# Altium footprint library PcbLib_Discrete_ThroughHole.PcbLib: 104 footprints (part 5 of 7)
Each footprint in its own frame and in the unit in brackets; x right, y up, seen from the top. Pads: shape width x height; smd on the part's side, far side on the other; paste and mask are expansions set on the pad; w line width, h text height; cw(c..) or ccw(c..) is an arc to the next point about the centre after c.
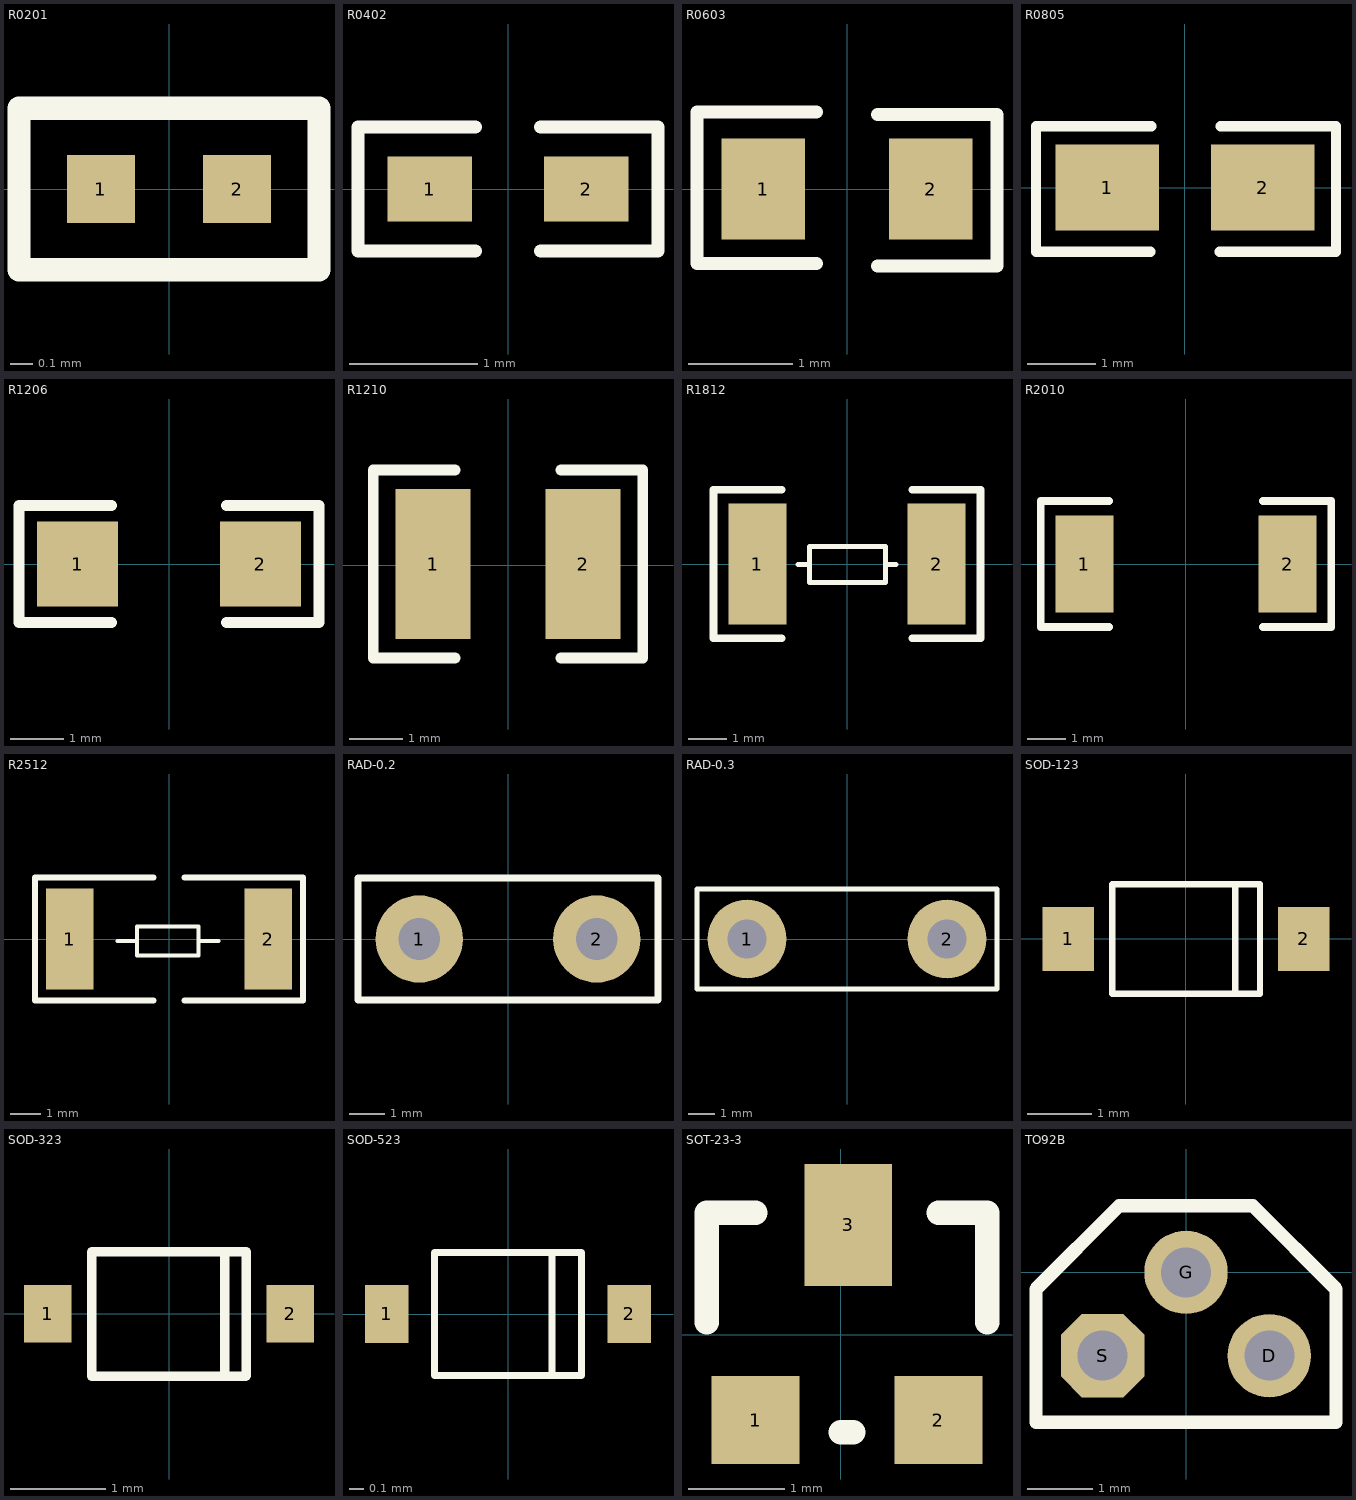
[diagram p4: the footprints below, top view; thin cyan lines are the x and y axes]

## R0201 [mm] "1/20W (0.05W)"
pads (2):
  rect 0.3x0.3 smd: 1(-0.3,0) 2(0.3,0)
Top Overlay:
  lines w0.102: -0.66,-0.356 0.66,-0.356 0.66,0.356 -0.66,0.356 -0.66,-0.356
3D body "Res-0201.STEP": height 0.24, standoff -0.01, extent -0.325,-0.162 0.325,0.162

## R0402 [mil] "1/16W (0.0625W)"
pads (2):
  rect 26x20 smd: 1(-24,0) 2(24,0)
Top Overlay:
  lines w4: -10,-19 -46,-19 -46,19 -10,19 ; 10,-19 46,-19 46,19 10,19
3D body "RESC-0402-Black.STEP": height 16.14, standoff 0, extent -23.01,-10.82 18.33,10.83

## R0603 [mm] "1/10W (0.1W)"
pads (2):
  rect 0.8x0.965 smd: 1(-0.8,0) 2(0.8,0)
Top Overlay:
  lines w0.127: -1.435,-0.712 -0.292,-0.712 ; -1.435,-0.7 -1.435,0.737 -0.292,0.737 ; 0.292,-0.737 1.435,-0.737 1.435,0.7 ; 0.292,0.712 1.435,0.712
3D body "RESC-0603-Black.STEP": height 0.56, standoff 0, extent -0.9,-0.45 0.8,0.45

## R0805 [mil] "1/8W (0.125W)"
pads (2):
  rect 60x50 smd: 1(-45,0) 2(45,0)
Top Overlay:
  lines w6: -20,-37.13 -86.34,-37.13 -86.34,35.43 -19.41,35.43 ; 20,-37.13 86.93,-37.13 ; 20.59,35.43 87.52,35.43 87.52,-37.13
3D body "RESC-0805-Black.STEP": height 24.02, standoff 0, extent -44.01,-26.57 38.67,26.58

## R1206 [mil] "1/4W (0.25W)"
pads (2):
  rect 60x62.99 smd: 1(-67.5,0) 2(67.5,0)
Top Overlay:
  lines w8: -42.5,-43.31 -110.81,-43.31 -110.81,43.31 -42.5,43.31 ; 42.5,-43.31 110.81,-43.31 110.81,43.31 42.5,43.31
3D body "RESC-1206-Black.STEP": height 25.98, standoff 0, extent -65.52,-32.87 64.4,34.06

## R1210 [mm] "1/2W (0.5W)，1/3W (0.33W)"
height 1.45
pads (2):
  rect 1.4x2.8 smd: 1(-1.4,0.025) 2(1.4,0.025)
Top Overlay:
  lines w0.203: -0.991,-1.728 -2.515,-1.728 -2.515,1.778 -0.991,1.778 ; 0.991,-1.728 2.515,-1.728 2.515,1.778 0.991,1.778
3D body "RESC-1210-Black.STEP": height 0.61, standoff 0, extent -1.65,-1.35 1.65,1.35

## R1812 [mil] "1/2W (0.5W)，3/4W (0.75W)"
pads (2):
  rect 60x125 smd: 1(-92.5,0) 2(92.5,0)
Top Overlay:
  lines w5.12: -50.5,-0.61 -38.87,-0.61 ; 39.87,-0.61 50.5,-0.61 ; -38.87,-19.31 39.87,-19.31 39.87,18.09 -38.87,18.09 -38.87,-19.31
  lines w8: -67.5,-76.77 -138,-76.77 -138,76.77 -67.5,76.77 ; 67.5,-76.77 138,-76.77 138,76.77 67.5,76.77
3D body "User Library-Resistors1812.STEP": height 24.11, standoff -0.49, extent -97.07,-63.49 82.06,63.48

## R2010 [mm] "3/4W (0.75W)"
pads (2):
  rect 1.52x2.54 smd: 1(-2.665,0) 2(2.665,0)
Top Overlay:
  lines w0.203: -2.017,-1.651 -3.808,-1.651 -3.808,1.651 -2.017,1.651 ; 2.017,-1.651 3.808,-1.651 3.808,1.651 2.017,1.651
3D body "2010R.STEP": height 0.47, standoff 0, extent -2.498,-1.251 2.502,1.251

## R2512 [mil] "1W, 2W, ＞2W"
pads (2):
  rect 61x129.92 smd: 1(-127.5,0) 2(127.5,0)
Top Overlay:
  lines w5.12: -66.35,-2.61 -40.76,-2.61 ; 37.98,-2.61 63.57,-2.61 ; -40.76,-21.31 37.98,-21.31 37.98,16.09 -40.76,16.09 -40.76,-21.31
  lines w8: -20,-78.74 -171.78,-78.74 -171.78,78.74 -20,78.74 ; 20,-78.74 171.78,-78.74 171.78,78.74 20,78.74
3D body "R2512-2.STEP": height 27.56, standoff 0, extent -129.92,-66.93 129.92,66.93

## RAD-0.2 [mm]
pads (2):
  round 2.5 hole 1.2: 1(-2.54,0) 2(2.54,0)
Top Overlay:
  lines w0.2: -4.293,-1.753 4.293,-1.753 4.293,1.753 -4.293,1.753 -4.293,-1.753
3D body "User Library-Ceramic Disc Capacitor 0_2in pitch.STEP": height 7.06, standoff -1.44, extent -3.5,-0.848 3.5,0.848

## RAD-0.3 [mm]
pads (2):
  round 3 hole 1.5: 1(-3.81,0) 2(3.81,0)
Top Overlay:
  lines w0.2: -5.715,-1.905 5.715,-1.905 5.715,1.905 -5.715,1.905 -5.715,-1.905
3D body "User Library-Capacitor MKT_B32591C3104 (Pitch 10mm).STEP": height 11.5, standoff -7, extent -6.373,-2.46 6.627,2.54

## SOD-123 [mm] "塑封二极管"
pads (2):
  rect 0.8x1 smd: 1(-1.829,0) 2(1.829,0)
Top Overlay:
  lines w0.1: 0.762,-0.85 0.762,0.85 ; -1.143,-0.85 1.149,-0.85 1.149,0.85 -1.143,0.85 -1.143,-0.85
3D body "SOD-123_DiodesInc.STEP": height 1.43, standoff -0.02, extent -1.9,-0.889 1.95,0.811

## SOD-323 [mm] "塑封二极管"
pads (2):
  rect 0.5x0.6 smd: 1(-1.27,0) 2(1.27,0)
Top Overlay:
  lines w0.1: 0.584,-0.651 0.584,0.649 ; 0.805,-0.649 0.803,-0.651 -0.81,-0.651 -0.81,0.649 0.81,0.649 0.81,-0.649
3D body "SOD323.STEP": height 0.9, standoff -0.09, extent -1.25,-0.625 1.25,0.625

## SOD-523 [mm] "塑封二极管"
pads (2):
  rect 0.3x0.4 smd: 1(-0.838,0) 2(0.838,0)
Top Overlay:
  lines w0.05: 0.305,-0.425 0.305,0.425 ; -0.508,-0.425 0.508,-0.425 0.508,0.425 -0.508,0.425 -0.508,-0.425
3D body "SOD-523.STEP": height 0.65, standoff 0, extent -0.8,-0.407 0.8,0.393

## SOT-23-3 [mil]
pads (3):
  rect 36x36 smd: 1(-35,-35) 2(40,-35)
  rect 36x50 smd: 3(3,45)
Top Overlay:
  lines w10: -55,5 -55,50 -35,50 ; 0,-40 5,-40 ; 40,50 60,50 60,5
3D body "SOT-23-3.STEP": height 47.24, standoff 0, extent -54.08,-48.11 60.09,62.12

## TO92B [mil] "92晶体管"
pads (3):
  round 50 hole 30: D(50,-50) G(0,0)
  oct 50x50 hole 30: S(-50,-50)
Top Overlay:
  lines w8: -90,-90 -90,-10 -40,40 40,40 90,-10 90,-90 -90,-90
3D body "TO92.STEP": height 283.41, standoff -133.91, extent -90.55,-100 90.55,41.54